# Altium footprint library Led & Displays.PcbLib: 52 footprints (part 1 of 4)
Each footprint in its own frame and in the unit in brackets; x right, y up, seen from the top. Pads: shape width x height; smd on the part's side, far side on the other; paste and mask are expansions set on the pad; w line width, h text height; cw(c..) or ccw(c..) is an arc to the next point about the centre after c.
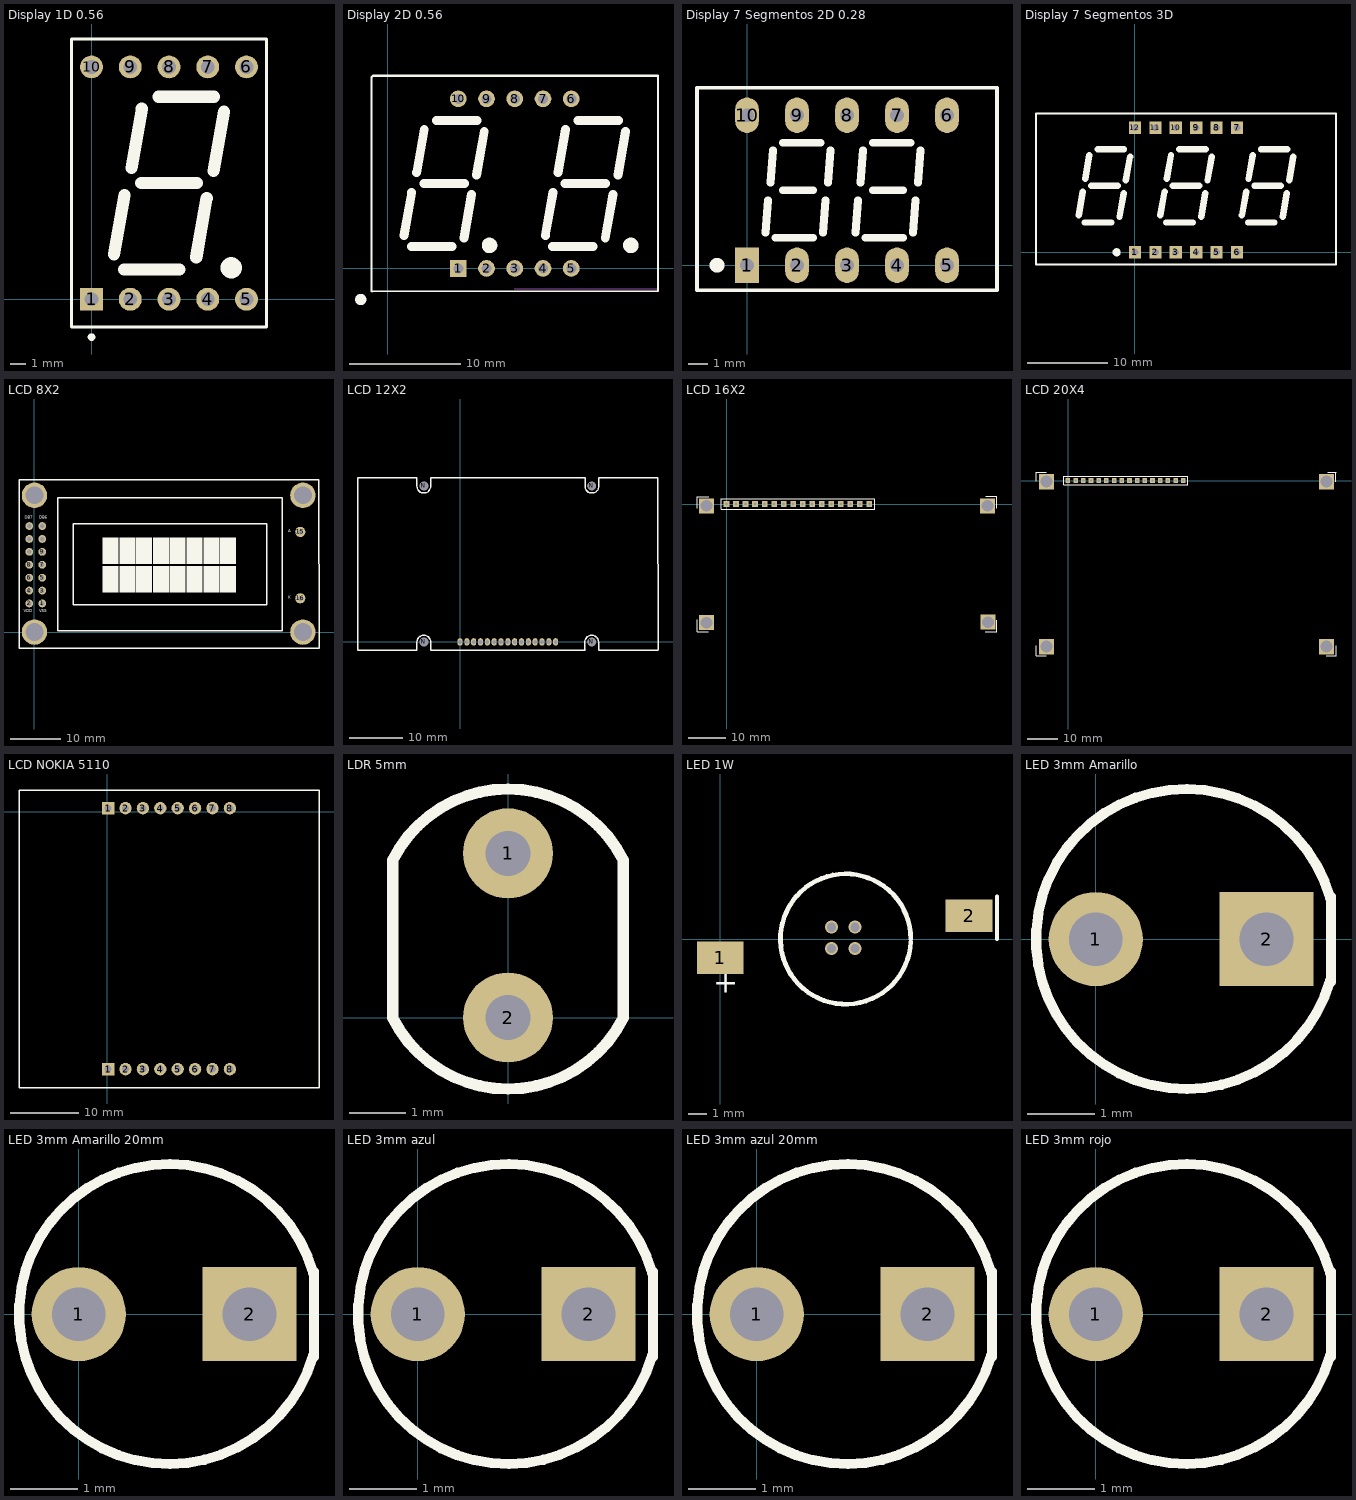
[diagram p0: the footprints below, top view; thin cyan lines are the x and y axes]

## Display 1D 0.56 [mm] "Display 7 segmentos 1 Digito 0.56\""
pads (10):
  rect 1.5x1.5 hole 0.9: 1(0,0)
  round 1.5 hole 0.9: 2(2.54,0) 3(5.08,0) 4(7.62,0) 5(10.16,0) 6(10.16,15.24) 7(7.62,15.24) 8(5.08,15.24) 9(2.54,15.24) 10(0,15.24)
Top Overlay:
  circle w0.8: c9.16,2.066 r0.296
  circle w0.25: c0,-2.48 r0.125
  lines w0.2: -1.32,-1.83 11.48,-1.83 11.48,17.07 -1.32,17.07 -1.32,-1.83
  lines w0.8: 1.48,2.947 2.163,6.831 ; 2.122,1.953 5.772,1.956 ; 2.614,8.607 3.295,12.494 ; 3.259,7.62 6.908,7.62 ; 4.391,13.283 8.04,13.283 ; 6.867,2.745 7.552,6.63 ; 7.999,8.408 8.682,12.297
Mechanical 13:
  lines w0.1: -1.32,-1.83 -1.32,17.07 11.48,17.07 11.48,-1.83 -1.32,-1.83
3D body "DISPLAY KEM-5611.step": height 8, standoff -6.3, extent -1.22,-1.88 11.38,17.12

## Display 2D 0.56 [mm] "Display 7 segmentos 2 Digito 0.56\" Mux"
pads (10):
  rect 1.5x1.5 hole 0.9: 1(6.35,0)
  round 1.5 hole 0.9: 2(8.89,0) 3(11.43,0) 4(13.97,0) 5(16.51,0) 6(16.51,15.24) 7(13.97,15.24) 8(11.43,15.24) 9(8.89,15.24) 10(6.35,15.24)
Top Overlay:
  circle w0.8: c21.86,2.066 r0.296
  circle w0.5: c-2.413,-2.794 r0.25
  circle w0.8: c9.16,2.066 r0.296
  lines w0.2: -1.447,-2.032 -1.395,-2.084 24.307,-2.032 24.307,17.324 -1.32,17.324 -1.447,17.197 -1.447,-2.032
  lines w0.8: 1.48,2.947 2.163,6.831 ; 2.122,1.953 5.772,1.956 ; 2.614,8.607 3.295,12.494 ; 3.259,7.62 6.908,7.62 ; 4.391,13.283 8.04,13.283 ; 6.867,2.745 7.552,6.63 ; 7.999,8.408 8.682,12.297 ; 14.18,2.947 14.863,6.831 ; 14.822,1.953 18.472,1.956 ; 15.314,8.607 15.995,12.494 ; 15.959,7.62 19.608,7.62 ; 17.091,13.283 20.74,13.283 ; 19.567,2.745 20.252,6.63 ; 20.699,8.408 21.382,12.297
Mechanical 13:
  lines w0.1: 11.38,-1.83 24.18,-1.83
3D body "display2dig.step": height 8, standoff -6.2, extent -1.07,-1.88 23.93,17.12

## Display 7 Segmentos 2D 0.28 [mm] "Display 7 Segmentos 2 Digitos 0.28 Inch"
pads (10):
  rect 1.2x1.8 hole 0.7: 1(0,0)
  oval 1.2x1.8 hole 0.7: 2(2.54,0) 3(5.08,0) 4(7.62,0) 5(10.16,0) 6(10.16,7.62) 7(7.62,7.62) 8(5.08,7.62) 9(2.54,7.62) 10(0,7.62)
Top Overlay:
  circle w0.5: c-1.524,0 r0.127
  lines w0.2: -2.54,-1.27 -2.54,9.017 12.7,9.017 12.7,-1.27 -2.54,-1.27
  lines w0.4: 0.938,1.651 1.065,3.302 ; 1.192,4.191 1.319,5.842 ; 1.446,1.397 3.351,1.397 ; 1.827,3.81 3.351,3.81 ; 1.827,6.223 3.732,6.223 ; 3.859,1.651 3.986,3.302 ; 4.113,4.191 4.24,5.842 ; 5.51,1.651 5.637,3.302 ; 5.764,4.191 5.891,5.842 ; 6.018,1.397 7.923,1.397 ; 6.399,3.81 7.923,3.81 ; 6.399,6.223 8.304,6.223 ; 8.431,1.651 8.558,3.302 ; 8.685,4.191 8.812,5.842
3D body "LTD-2601G.STEP": height 6.6, standoff -3, extent -2.413,-1.143 12.607,8.857

## Display 7 Segmentos 3D [mil] "Display 7 Segmentos 3 Digitos"
pads (12):
  rect 60x60 hole 33.46: 1(0,0) 2(100,0) 3(200,0) 4(300,0) 5(400,0) 6(500,0) 7(500,610) 8(400,610) 9(300,610) 10(200,610) 11(100,610) 12(0,610)
Top Overlay:
  circle w19.68: c-90,0 r10
  lines w7.87: -485,-60 -485,680 985,680 985,-60 -485,-60
  lines w31.5: -275.98,181.3 -255.12,297.44 ; -245.75,145.87 -117.32,145.87 ; -243.7,360.43 -223.62,476.18 ; -214.17,325 -85.04,325 ; -182.59,504.13 -53.94,504.13 ; -75.98,173.43 -55.51,289.57 ; -44.49,352.56 -24.02,468.7 ; 124.02,181.3 144.88,297.44 ; 154.25,145.87 282.68,145.87 ; 156.3,360.43 176.38,476.18 ; 185.83,325 314.96,325 ; 217.41,504.13 346.06,504.13 ; 324.02,173.43 344.49,289.57 ; 355.51,352.56 375.98,468.7 ; 524.02,181.3 544.88,297.44 ; 554.25,145.87 682.68,145.87 ; 556.3,360.43 576.38,476.18 ; 585.83,325 714.96,325 ; 617.41,504.13 746.06,504.13 ; 724.02,173.43 744.49,289.57 ; 755.51,352.56 775.98,468.7
3D body "3 Digit Display.step": height 393.7, standoff -82.68, extent -490.31,-68.03 990,680

## LCD 8X2 [mil] "Full LCD Component"
pads (20):
  round 60 hole 36: 1(60,221.5) 2(-40,221.5) 3(60,321.5) 4(-40,321.5) 5(60,421.5) 6(-40,421.5) 7(60,521.5) 8(-40,521.5) 9(60,621.5) 10(-40,621.5) 11(60,721.5) 12(-40,721.5) 13(60,821.5) 14(-40,821.5)
  round 78.74 hole 39.37: 15(2060,776.5) 16(2060,261.5)
  round 196.85 hole 137.8 unplated: ""(0,0) ""(0,1060) ""(2080,0) ""(2080,1060)
Top Overlay:
  region: 1440,510 1440,310 1560,310 1560,510
  region: 1440,730 1440,530 1560,530 1560,730
  region: 1310,510 1310,310 1430,310 1430,510
  region: 1310,730 1310,530 1430,530 1430,730
  region: 1180,510 1180,310 1300,310 1300,510
  region: 1180,730 1180,530 1300,530 1300,730
  region: 1050,510 1050,310 1170,310 1170,510
  region: 1050,730 1050,530 1170,530 1170,730
  region: 920,510 920,310 1040,310 1040,510
  region: 920,730 920,530 1040,530 1040,730
  region: 790,510 790,310 910,310 910,510
  region: 790,730 790,530 910,530 910,730
  region: 660,510 660,310 780,310 780,510
  region: 660,730 660,530 780,530 780,730
  region: 530,510 530,310 650,310 650,510
  region: 530,730 530,530 650,530 650,730
  lines w10: -120,-125 -120,1180 2205,1180 2205,-125 -120,-125 ; 180,10 180,1040 1920,1040 1920,10 180,10 ; 300,210 300,840 1800,840 1800,210 300,210
  text "DB7" at -75,871.82 h39.37
  text "DB6" at 35,871.82 h39.37
  text "K" at 1968.5,250 h39.37
  text "A" at 1968.5,765 h39.37
  text "VDD" at -85,146.81 h39.37
  text "VSS" at 35,145.31 h39.37
Mechanical 15:
  lines w0.1: 1094,534 1096,536
3D body "lcd 8x2.STEP": height 401.57, standoff 78.35, extent -105,-110 2178.46,1149.84

## LCD 12X2 [mm] "Full LCD Component"
pads (19):
  oval 0.95x1.4 hole 0.7: 1(0,0) 2(1.27,0) 3(2.54,0) 4(3.81,0) 5(5.08,0) 6(6.35,0) 7(7.62,0) 8(8.89,0) 9(10.16,0) 10(11.43,0) 11(12.7,0) 12(13.97,0) 13(15.24,0) 14(16.51,0) 15(17.78,0)
  round 1.524 hole 1.65: N(-6.72,0) N(-6.72,29) N(24.48,0) N(24.48,29)
Top Overlay:
  lines w0.254: 36.776,-1.524 25.781,-1.524 25.75,-1.493 25.75,0 ccw(c24.48,0) 23.21,0 23.21,-1.493 23.241,-1.524 -5.461,-1.524 -5.461,0 ccw(c-6.731,0) -8.001,0 -8.001,-1.5 -18.96,-1.5 -18.96,30.5 -8.005,30.5 -8.001,30.504 -8.001,28.956 ccw(c-6.731,28.956) -5.461,28.956 -5.461,30.48 23.241,30.48 23.241,28.956 ccw(c24.511,28.956) 25.781,28.956 25.781,30.504 36.789,30.504 ; 36.793,30.5 36.8,-1.5

## LCD 16X2 [mil] "Full LCD Component"
pads (20):
  rect 60x60 hole 31.5: 1(0,0) 2(100,0) 3(200,0) 4(300,0) 5(400,0) 6(500,0) 7(600,0) 8(700,0) 9(800,0) 10(900,0) 11(1000,0) 12(1100,0) 13(1200,0) 14(1300,0) 15(1400,0) 16(1500,0)
  rect 157.48x157.48 hole 122.05: ""(-210,-1245) ""(-210,-20) ""(2740,-20) ""(2745,-1240)
Top Overlay:
  lines w7.87: -310,-1215 -310,-1340 -190,-1340 ; -310,-45 -310,75 -185,75 ; 2715,-1340 2840,-1340 2840,-1220 ; 2720,80 2840,80 2840,-45 ; -55,-55 -55,55 1555,55 1555,-55 -55,-55
3D body "Header_Male_1Pin.STEP": height 433.07, standoff -21.26, extent 1150.01,-49.01 1250.01,49.02
3D body "Header_Male_1Pin.STEP": height 433.07, standoff -21.26, extent 1250.01,-49.01 1350.01,49.02
3D body "Header_Male_1Pin.STEP": height 433.07, standoff -21.26, extent 1450.01,-49.01 1550.01,49.02
3D body "Header_Male_1Pin.STEP": height 433.07, standoff -21.26, extent 1350.01,-49.01 1450.01,49.02
3D body "Header_Male_1Pin.STEP": height 433.07, standoff -21.26, extent 750.01,-49.01 850.01,49.02
3D body "Header_Male_1Pin.STEP": height 433.07, standoff -21.26, extent 850.01,-49.01 950.01,49.02
3D body "Header_Male_1Pin.STEP": height 433.07, standoff -21.26, extent 1050.01,-49.01 1150.01,49.02
3D body "Header_Male_1Pin.STEP": height 433.07, standoff -21.26, extent 950.01,-49.01 1050.01,49.02
3D body "Header_Male_1Pin.STEP": height 433.07, standoff -21.26, extent 350.01,-49.01 450.01,49.02
3D body "Header_Male_1Pin.STEP": height 433.07, standoff -21.26, extent 450.01,-49.01 550.01,49.02
3D body "Header_Male_1Pin.STEP": height 433.07, standoff -21.26, extent 650.01,-49.01 750.01,49.02
3D body "Header_Male_1Pin.STEP": height 433.07, standoff -21.26, extent 550.01,-49.01 650.01,49.02
3D body "Header_Male_1Pin.STEP": height 433.07, standoff -21.26, extent 150.01,-49.01 250.01,49.02
3D body "Header_Male_1Pin.STEP": height 433.07, standoff -21.26, extent 250.01,-49.01 350.01,49.02
3D body "Header_Male_1Pin.STEP": height 433.07, standoff -21.26, extent 50.01,-49.01 150.01,49.02
3D body "Header_Male_1Pin.STEP": height 433.07, standoff -21.26, extent -49.99,-49.01 50.01,49.02
3D body "LCD 16x2 JHD162A.step": height 736.22, standoff 218.5, extent -309.8,-1338.66 2839.81,78.67

## LCD 20X4 [mil] "Full LCD Component"
pads (20):
  rect 60x60 hole 31.5: 1(-5,0) 2(95,0) 3(195,0) 4(295,0) 5(395,0) 6(495,0) 7(595,0) 8(695,0) 9(795,0) 10(895,0) 11(995,0) 12(1095,0) 13(1195,0) 14(1295,0) 15(1395,0) 16(1495,0)
  rect 196.85x196.85 hole 157.48: ""(-285,-2160) ""(-285,-15) ""(3354.61,-2160) ""(3354.61,-15)
Top Overlay:
  lines w7.87: -420,-2150 -420,-2280 -290,-2280 ; -420,-10 -420,110 -290,110 ; 3350,-2275 3480,-2275 3480,-2145 ; 3375,105 3480,105 ; 3479.77,-14.92 3479.77,105.08 ; -60,-55 1550,-55 1550,55 -60,55 -60,-55
3D body "LCD2004.step": height 681.1, standoff 393.7, extent -415,-2270 3474.77,100.08
3D body: height 295.28, standoff 13.78, extent -55,-49.01 1545,49.02
3D body "Header_Male_1Pin.STEP": height 511.81, standoff 57.48, extent -55,-49.01 45,49.02
3D body "Header_Male_1Pin.STEP": height 511.81, standoff 57.48, extent 45,-49.01 145,49.02
3D body "Header_Male_1Pin.STEP": height 511.81, standoff 57.48, extent 245,-49.01 345,49.02
3D body "Header_Male_1Pin.STEP": height 511.81, standoff 57.48, extent 145,-49.01 245,49.02
3D body "Header_Male_1Pin.STEP": height 511.81, standoff 57.48, extent 545,-49.01 645,49.02
3D body "Header_Male_1Pin.STEP": height 511.81, standoff 57.48, extent 645,-49.01 745,49.02
3D body "Header_Male_1Pin.STEP": height 511.81, standoff 57.48, extent 445,-49.01 545,49.02
3D body "Header_Male_1Pin.STEP": height 511.81, standoff 57.48, extent 345,-49.01 445,49.02
3D body "Header_Male_1Pin.STEP": height 511.81, standoff 57.48, extent 945,-49.01 1045,49.02
3D body "Header_Male_1Pin.STEP": height 511.81, standoff 57.48, extent 1045,-49.01 1145,49.02
3D body "Header_Male_1Pin.STEP": height 511.81, standoff 57.48, extent 845,-49.01 945,49.02
3D body "Header_Male_1Pin.STEP": height 511.81, standoff 57.48, extent 745,-49.01 845,49.02
3D body "Header_Male_1Pin.STEP": height 511.81, standoff 57.48, extent 1345,-49.01 1445,49.02
3D body "Header_Male_1Pin.STEP": height 511.81, standoff 57.48, extent 1445,-49.01 1545,49.02
3D body "Header_Male_1Pin.STEP": height 511.81, standoff 57.48, extent 1245,-49.01 1345,49.02
3D body "Header_Male_1Pin.STEP": height 511.81, standoff 57.48, extent 1145,-49.01 1245,49.02

## LCD NOKIA 5110 [mm] "LCD Gráfica 5110 Nokia"
pads (16):
  rect 1.8x1.8 hole 1: 1(0.144,-37.576) 1(0.144,0.524)
  round 1.8 hole 1: 2(2.684,-37.576) 2(2.684,0.524) 3(5.224,-37.576) 3(5.224,0.524) 4(7.764,-37.576) 4(7.764,0.524) 5(10.304,-37.576) 5(10.304,0.524) 6(12.844,-37.576) 6(12.844,0.524) 7(15.384,-37.576) 7(15.384,0.524) 8(17.924,-37.576) 8(17.924,0.524)
Top Overlay:
  lines w0.2: -12.866,-40.326 30.934,-40.326 30.934,3.174 -12.866,3.174 -12.866,-40.326
3D body "NOKIA 5110 BreakOut Board.STEP": height 15, standoff 10, extent -12.766,-40.557 30.834,2.743

## LDR 5mm [mm] "Resistencia Variable LDR"
pads (2):
  round 1.6 hole 0.8: 1(0,2.921) 2(0,0)
Top Overlay:
  lines w0.2: -2.049,-0.008 ccw(c0,1.024) 2.049,-0.008 2.049,2.802 ccw(c0,1.77) -2.049,2.802 -2.049,-0.008
3D body "LDR.step": height 3.74, standoff -1, extent -2.141,-1.208 2.159,4.002

## LED 1W [mm] "Led 1W"
pads (2):
  rect 2.5x1.75 smd: 1(0,-1) 2(13.357,1.254)
via 5.969,0.635 diameter 0.7 hole 0.5
via 7.239,0.635 diameter 0.7 hole 0.5
via 7.239,-0.508 diameter 0.7 hole 0.5
via 5.969,-0.508 diameter 0.7 hole 0.5
Top Overlay:
  lines w0.2: 14.859,0 14.859,2.286
  lines w0.254: 10.228,-0.146 cw(c6.731,0) 10.231,0
  text "+" at -0.381,-3.302 h2
3D body "LED 1w.step": height 5.55, standoff 0, extent -0.646,-3.873 13.854,4.127

## LED 3mm Amarillo [mm] "LED estándar 3mm"
pads (2):
  round 1.4 hole 0.8: 1(0,0)
  rect 1.4x1.4 hole 0.8: 2(2.54,0)
Top Overlay:
  lines w0.15: 3.486,-0.615 cw(c1.342,0.002) 3.488,0.615 ; 3.5,-0.635 3.5,0.635
3D body "LED 3mm Yellow 3mm Leads.step": height 5.39, standoff -2.99, extent -0.655,-1.924 2.79,1.924

## LED 3mm Amarillo 20mm [mm] "LED estándar 3mm"
pads (2):
  round 1.4 hole 0.8: 1(0,0)
  rect 1.4x1.4 hole 0.8: 2(2.54,0)
Top Overlay:
  lines w0.15: 3.486,-0.615 cw(c1.342,0.002) 3.488,0.615 ; 3.5,-0.635 3.5,0.635
3D body "LED 3mm Yellow 21mm Leads.step": height 23.39, standoff -2.99, extent -0.655,-1.924 2.84,1.924

## LED 3mm azul [mm] "LED estándar 3mm"
pads (2):
  round 1.4 hole 0.8: 1(0,0)
  rect 1.4x1.4 hole 0.8: 2(2.54,0)
Top Overlay:
  lines w0.15: 3.486,-0.615 cw(c1.342,0.002) 3.488,0.615 ; 3.5,-0.635 3.5,0.635
3D body "LED 3mm Blue 3mm Leads.step": height 5.39, standoff -2.99, extent -0.591,-1.924 2.854,1.924

## LED 3mm azul 20mm [mm] "LED estándar 3mm"
pads (2):
  round 1.4 hole 0.8: 1(0,0)
  rect 1.4x1.4 hole 0.8: 2(2.54,0)
Top Overlay:
  lines w0.15: 3.486,-0.615 cw(c1.342,0.002) 3.488,0.615 ; 3.5,-0.635 3.5,0.635
3D body "LED 3mm Blue 21mm Leads.step": height 23.39, standoff -2.99, extent -0.655,-1.924 2.84,1.924

## LED 3mm rojo [mm] "LED estándar 3mm"
pads (2):
  round 1.4 hole 0.8: 1(0,0)
  rect 1.4x1.4 hole 0.8: 2(2.54,0)
Top Overlay:
  lines w0.15: 3.486,-0.615 cw(c1.342,0.002) 3.488,0.615 ; 3.5,-0.635 3.5,0.635
3D body "LED 3mm Red 3mm Leads.step": height 5.39, standoff -2.99, extent -0.655,-1.924 2.79,1.924